# Altium footprint library Reflow3D1411sep.PcbLib: 657 footprints (part 17 of 42)
Each footprint in its own frame and in the unit in brackets; x right, y up, seen from the top. Pads: shape width x height; smd on the part's side, far side on the other; paste and mask are expansions set on the pad; w line width, h text height; cw(c..) or ccw(c..) is an arc to the next point about the centre after c.
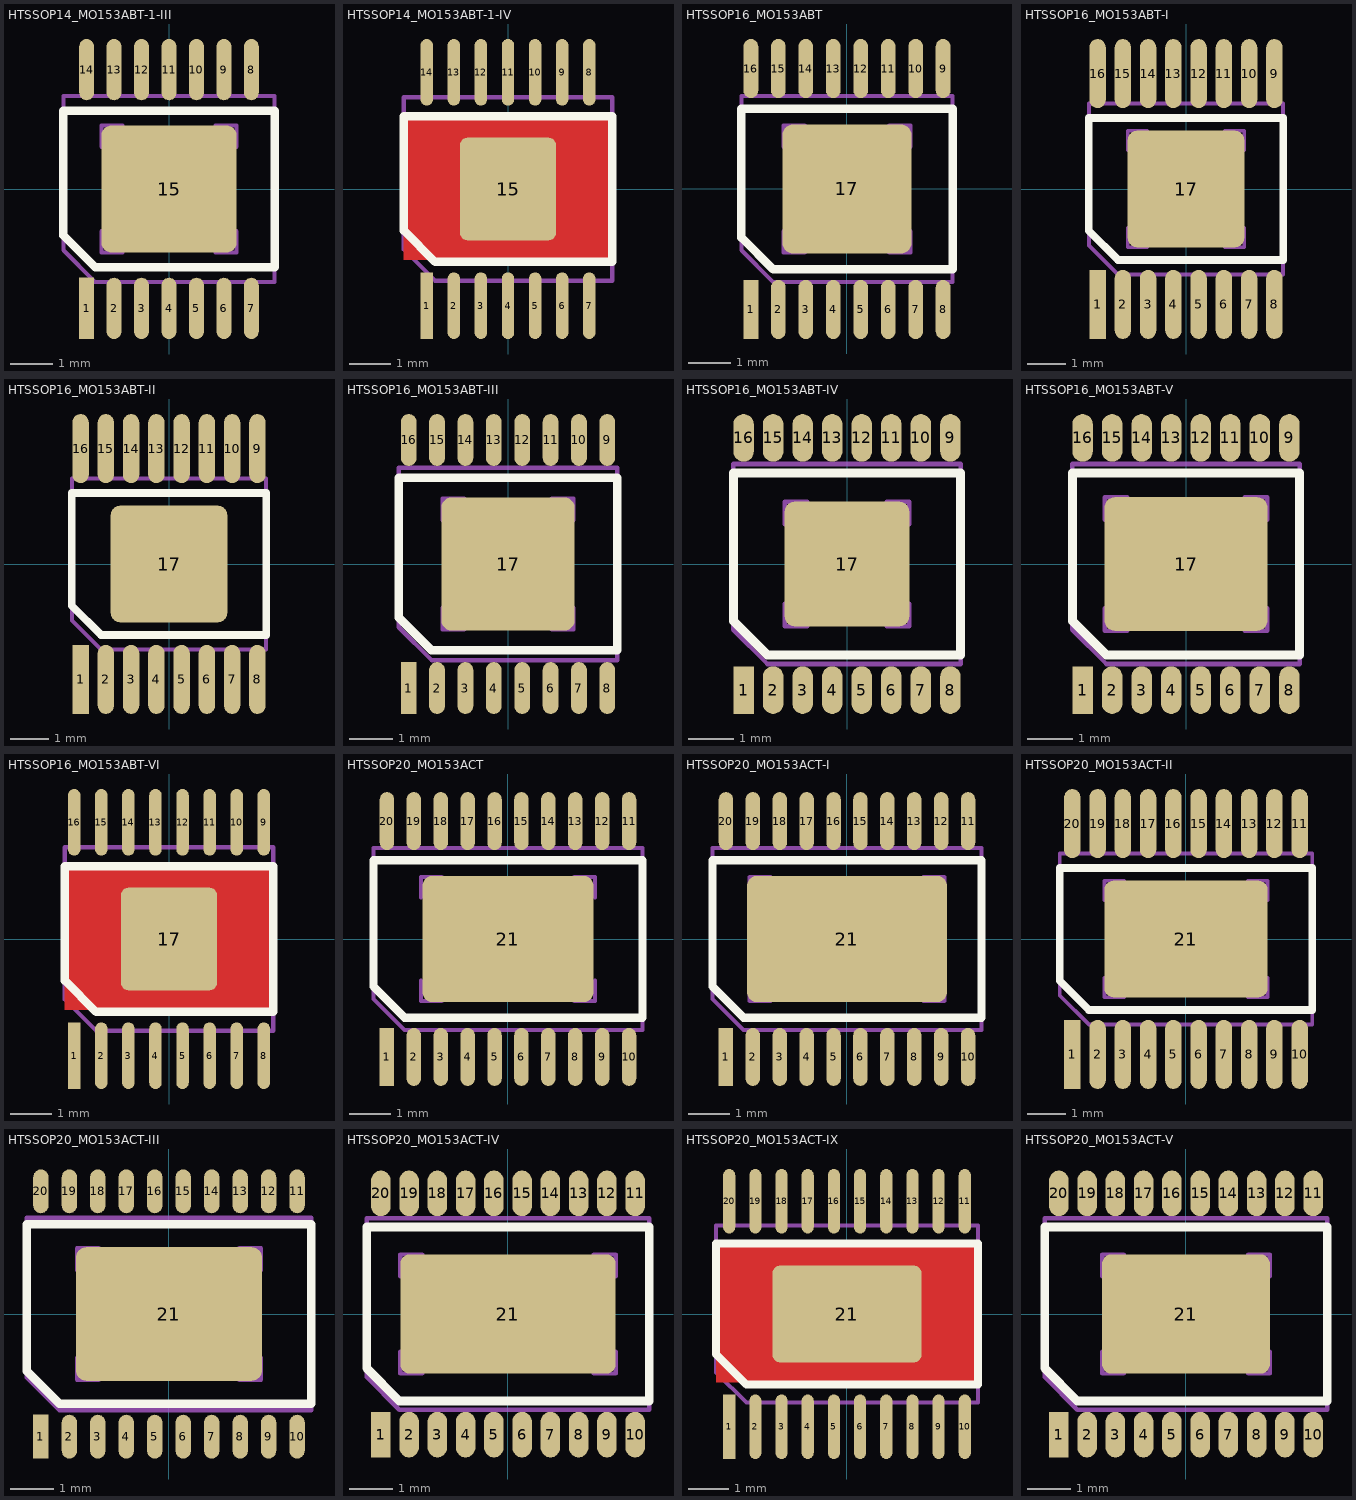
[diagram p16: the footprints below, top view; thin cyan lines are the x and y axes]

## HTSSOP14_MO153ABT-1-III [mm] "www.intersil.com, M14.173A.pdf; www.jedec.org, MO-153f.pdf"
height 1
pads (15):
  rect 0.35x1.45 smd mask+0.075: 1(-1.95,-2.825)
  oval 0.35x1.45 smd mask+0.075: 2(-1.3,-2.825) 3(-0.65,-2.825) 4(0,-2.825) 5(0.65,-2.825) 6(1.3,-2.825) 7(1.95,-2.825) 8(1.95,2.825) 9(1.3,2.825) 10(0.65,2.825) 11(0,2.825) 12(-0.65,2.825) 13(-1.3,2.825) 14(-1.95,2.825)
  rrect15% 3.2x3 smd mask+0.075: 15(0,0)
Top Overlay:
  lines w0.2: -2.5,-1.1 -1.75,-1.85 2.5,-1.85 2.5,1.85 -2.5,1.85 -2.5,-1.1
Mechanical 13:
  lines w0.1: -1.6,-1 -1.6,-1.5 -1.1,-1.5 ; -1.6,1 -1.6,1.5 -1.1,1.5 ; 1.1,-1.5 1.6,-1.5 1.6,-1 ; 1.1,1.5 1.6,1.5 1.6,1 ; -2.5,-1.45 -1.75,-2.2 2.5,-2.2 2.5,2.2 -2.5,2.2 -2.5,-1.45
Mechanical 15:
  lines w0.1: -0.5,0 0.5,0 ; 0,-0.5 0,0.5
3D body: height 1.2, standoff 0, extent -2.55,-2.25 2.55,2.25

## HTSSOP14_MO153ABT-1-IV [mm] "www.ti.com, tlv2474.pdf"
height 1.1
pads (15):
  rect 0.3x1.6 smd mask+0.075: 1(-1.95,-2.8)
  oval 0.3x1.6 smd mask+0.075: 2(-1.3,-2.8) 3(-0.65,-2.8) 4(0,-2.8) 5(0.65,-2.8) 6(1.3,-2.8) 7(1.95,-2.8) 8(1.95,2.8) 9(1.3,2.8) 10(0.65,2.8) 11(0,2.8) 12(-0.65,2.8) 13(-1.3,2.8) 14(-1.95,2.8)
  rrect15% 2.31x2.46 smd mask+0: 15(0,0)
Top Layer:
  region: -2.5,1.7 2.5,1.7 2.5,-1.7 -2.5,-1.7
Top Overlay:
  lines w0.2: -2.5,-1 -1.75,-1.75 2.5,-1.75 2.5,1.75 -2.5,1.75 -2.5,-1
Mechanical 13:
  lines w0.1: -0.915,-0.53 -0.915,-1.03 -0.415,-1.03 ; -0.915,0.53 -0.915,1.03 -0.415,1.03 ; 0.415,-1.03 0.915,-1.03 0.915,-0.53 ; 0.415,1.03 0.915,1.03 0.915,0.53 ; -2.5,-1.45 -1.75,-2.2 2.5,-2.2 2.5,2.2 -2.5,2.2 -2.5,-1.45
Mechanical 15:
  lines w0.1: -0.5,0 0.5,0 ; 0,-0.5 0,0.5
3D body: height 1.2, standoff 0, extent -2.55,-2.25 2.55,2.25

## HTSSOP16_MO153ABT [mm] "www.maxim-ic.com, 21-0108.PDF, 90-0120.PDF"
height 1
pads (17):
  rect 0.35x1.4 smd mask+0.075: 1(-2.275,-2.85)
  oval 0.35x1.4 smd mask+0.075: 2(-1.625,-2.85) 3(-0.975,-2.85) 4(-0.325,-2.85) 5(0.325,-2.85) 6(0.975,-2.85) 7(1.625,-2.85) 8(2.275,-2.85) 9(2.275,2.85) 10(1.625,2.85) 11(0.975,2.85) 12(0.325,2.85) 13(-0.325,2.85) 14(-0.975,2.85) 15(-1.625,2.85) 16(-2.275,2.85)
  rrect15% 3.05x3.05 smd mask+0.075: 17(0,0)
Top Overlay:
  lines w0.2: -2.5,-1.15 -1.75,-1.9 2.5,-1.9 2.5,1.9 -2.5,1.9 -2.5,-1.15
Mechanical 13:
  lines w0.1: -1.5,-1 -1.5,-1.5 -1,-1.5 ; -1.5,1 -1.5,1.5 -1,1.5 ; 1,-1.5 1.5,-1.5 1.5,-1 ; 1,1.5 1.5,1.5 1.5,1 ; -2.5,-1.45 -2.5,2.2 2.5,2.2 2.5,-2.2 -1.75,-2.2 -2.5,-1.45
Mechanical 15:
  lines w0.1: -0.5,0 0.5,0 ; 0,-0.5 0,0.5
3D body: height 1.1, standoff 0, extent -2.55,-2.25 2.55,2.25

## HTSSOP16_MO153ABT-I [mm] "www.national.com, mxa16a.pdf"
height 1
pads (17):
  rect 0.42x1.78 smd mask+0.05: 1(-2.275,-2.97)
  oval 0.42x1.78 smd mask+0.05: 2(-1.625,-2.97) 3(-0.975,-2.97) 4(-0.325,-2.97) 5(0.325,-2.97) 6(0.975,-2.97) 7(1.625,-2.97) 8(2.275,-2.97) 9(2.275,2.97) 10(1.625,2.97) 11(0.975,2.97) 12(0.325,2.97) 13(-0.325,2.97) 14(-0.975,2.97) 15(-1.625,2.97) 16(-2.275,2.97)
  rrect15% 3x3 smd mask+0.075: 17(0,0)
Top Overlay:
  lines w0.2: -2.5,-1.075 -1.75,-1.825 2.5,-1.825 2.5,1.825 -2.5,1.825 -2.5,-1.075
Mechanical 13:
  lines w0.1: -1.5,-1 -1.5,-1.5 -1,-1.5 ; -1.5,1 -1.5,1.5 -1,1.5 ; 1,-1.5 1.5,-1.5 1.5,-1 ; 1,1.5 1.5,1.5 1.5,1 ; -2.5,-1.45 -1.75,-2.2 2.5,-2.2 2.5,2.2 -2.5,2.2 -2.5,-1.45
Mechanical 15:
  lines w0.1: -0.5,0 0.5,0 ; 0,-0.5 0,0.5
3D body: height 1.1, standoff 0, extent -2.55,-2.25 2.55,2.25

## HTSSOP16_MO153ABT-II [mm] "www.fairchildsemi.com, MTF16.pdf"
height 1
pads (17):
  rect 0.42x1.78 smd mask+0.05: 1(-2.275,-2.97)
  oval 0.42x1.78 smd mask+0.05: 2(-1.625,-2.97) 3(-0.975,-2.97) 4(-0.325,-2.97) 5(0.325,-2.97) 6(0.975,-2.97) 7(1.625,-2.97) 8(2.275,-2.97) 9(2.275,2.97) 10(1.625,2.97) 11(0.975,2.97) 12(0.325,2.97) 13(-0.325,2.97) 14(-0.975,2.97) 15(-1.625,2.97) 16(-2.275,2.97)
  rrect15% 3x3 smd mask+0.075: 17(0,0)
Top Overlay:
  lines w0.2: -2.5,-1.075 -1.75,-1.825 2.5,-1.825 2.5,1.825 -2.5,1.825 -2.5,-1.075
Mechanical 13:
  lines w0.1: -1.25,-0.75 -1.25,-1.25 -0.75,-1.25 ; -1.25,0.75 -1.25,1.25 -0.75,1.25 ; 0.75,-1.25 1.25,-1.25 1.25,-0.75 ; 0.75,1.25 1.25,1.25 1.25,0.75 ; -2.5,-1.45 -1.75,-2.2 2.5,-2.2 2.5,2.2 -2.5,2.2 -2.5,-1.45
Mechanical 15:
  lines w0.1: -0.5,0 0.5,0 ; 0,-0.5 0,0.5
3D body: height 1.2, standoff 0, extent -2.55,-2.25 2.55,2.25

## HTSSOP16_MO153ABT-III [mm] "www.analog.com, RE_16_2.pdf, RE-16-2.pdf; www.jedec.org, MO-153f.pdf"
height 1.1
pads (17):
  rect 0.36x1.19 smd mask+0.075: 1(-2.275,-2.84)
  oval 0.36x1.19 smd mask+0.075: 2(-1.625,-2.84) 3(-0.975,-2.84) 4(-0.325,-2.84) 5(0.325,-2.84) 6(0.975,-2.84) 7(1.625,-2.84) 8(2.275,-2.84) 9(2.275,2.84) 10(1.625,2.84) 11(0.975,2.84) 12(0.325,2.84) 13(-0.325,2.84) 14(-0.975,2.84) 15(-1.625,2.84) 16(-2.275,2.84)
  rrect15% 3.05x3.05 smd mask+0.075: 17(0,0)
Top Overlay:
  lines w0.2: -2.5,-1.225 -1.75,-1.975 2.5,-1.975 2.5,1.975 -2.5,1.975 -2.5,-1.225
Mechanical 13:
  lines w0.1: -1.5,-1 -1.5,-1.5 -1,-1.5 ; -1.5,1 -1.5,1.5 -1,1.5 ; 1,-1.5 1.5,-1.5 1.5,-1 ; 1,1.5 1.5,1.5 1.5,1 ; -2.5,-1.45 -2.5,2.2 2.5,2.2 2.5,-2.2 -1.75,-2.2 -2.5,-1.45
Mechanical 15:
  lines w0.1: -0.5,0 0.5,0 ; 0,-0.5 0,0.5
3D body: height 1.2, standoff 0, extent -2.55,-2.25 2.55,2.25

## HTSSOP16_MO153ABT-IV [mm] "www.linear.com, TSSOP_16_05-08-1663_Variation_BA.pdf"
height 1
pads (17):
  rect 0.45x1.05 smd mask+0.05: 1(-2.275,-2.775)
  oval 0.45x1.05 smd mask+0.05: 2(-1.625,-2.775) 3(-0.975,-2.775) 4(-0.325,-2.775) 5(0.325,-2.775) 6(0.975,-2.775) 7(1.625,-2.775) 8(2.275,-2.775) 9(2.275,2.775) 10(1.625,2.775) 11(0.975,2.775) 12(0.325,2.775) 13(-0.325,2.775) 14(-0.975,2.775) 15(-1.625,2.775) 16(-2.275,2.775)
  rrect15% 2.74x2.74 smd mask+0.075: 17(0,0)
Top Overlay:
  lines w0.2: -2.5,-1.25 -2.5,2 2.5,2 2.5,-2 -1.75,-2 -2.5,-1.25
Mechanical 13:
  lines w0.1: -1.37,-0.87 -1.37,-1.37 -0.87,-1.37 ; -1.37,0.87 -1.37,1.37 -0.87,1.37 ; 0.87,-1.37 1.37,-1.37 1.37,-0.87 ; 0.87,1.37 1.37,1.37 1.37,0.87 ; -2.5,-1.45 -1.75,-2.2 2.5,-2.2 2.5,2.2 -2.5,2.2 -2.5,-1.45
Mechanical 15:
  lines w0.1: -0.5,0 0.5,0 ; 0,-0.5 0,0.5
3D body: height 1.1, standoff 0, extent -2.55,-2.25 2.55,2.25

## HTSSOP16_MO153ABT-V [mm] "www.linear.com, TSSOP_16_05-08-1663_Variation_BB.pdf"
height 1
pads (17):
  rect 0.45x1.05 smd mask+0.05: 1(-2.275,-2.775)
  oval 0.45x1.05 smd mask+0.05: 2(-1.625,-2.775) 3(-0.975,-2.775) 4(-0.325,-2.775) 5(0.325,-2.775) 6(0.975,-2.775) 7(1.625,-2.775) 8(2.275,-2.775) 9(2.275,2.775) 10(1.625,2.775) 11(0.975,2.775) 12(0.325,2.775) 13(-0.325,2.775) 14(-0.975,2.775) 15(-1.625,2.775) 16(-2.275,2.775)
  rrect15% 3.58x2.94 smd mask+0.075: 17(0,0)
Top Overlay:
  lines w0.2: -2.5,-1.25 -2.5,2 2.5,2 2.5,-2 -1.75,-2 -2.5,-1.25
Mechanical 13:
  lines w0.1: -1.79,-0.97 -1.79,-1.47 -1.29,-1.47 ; -1.79,0.97 -1.79,1.47 -1.29,1.47 ; 1.29,-1.47 1.79,-1.47 1.79,-0.97 ; 1.29,1.47 1.79,1.47 1.79,0.97 ; -2.5,-1.45 -1.75,-2.2 2.5,-2.2 2.5,2.2 -2.5,2.2 -2.5,-1.45
Mechanical 15:
  lines w0.1: -0.5,0 0.5,0 ; 0,-0.5 0,0.5
3D body: height 1.1, standoff 0, extent -2.55,-2.25 2.55,2.25

## HTSSOP16_MO153ABT-VI [mm] "www.ti.com, tlv2474.pdf"
height 1.1
pads (17):
  rect 0.3x1.6 smd mask+0.075: 1(-2.275,-2.8)
  oval 0.3x1.6 smd mask+0.075: 2(-1.625,-2.8) 3(-0.975,-2.8) 4(-0.325,-2.8) 5(0.325,-2.8) 6(0.975,-2.8) 7(1.625,-2.8) 8(2.275,-2.8) 9(2.275,2.8) 10(1.625,2.8) 11(0.975,2.8) 12(0.325,2.8) 13(-0.325,2.8) 14(-0.975,2.8) 15(-1.625,2.8) 16(-2.275,2.8)
  rrect15% 2.31x2.46 smd mask+0: 17(0,0)
Top Layer:
  region: -2.5,1.7 2.5,1.7 2.5,-1.7 -2.5,-1.7
Top Overlay:
  lines w0.2: -2.5,-1 -2.5,1.75 2.5,1.75 2.5,-1.75 -1.75,-1.75 -2.5,-1
Mechanical 13:
  lines w0.1: -0.935,-0.555 -0.935,-1.055 -0.435,-1.055 ; -0.935,0.555 -0.935,1.055 -0.435,1.055 ; 0.435,-1.055 0.935,-1.055 0.935,-0.555 ; 0.435,1.055 0.935,1.055 0.935,0.555 ; -2.5,-1.45 -2.5,2.2 2.5,2.2 2.5,-2.2 -1.75,-2.2 -2.5,-1.45
Mechanical 15:
  lines w0.1: -0.5,0 0.5,0 ; 0,-0.5 0,0.5
3D body: height 1.2, standoff 0, extent -2.55,-2.25 2.55,2.25

## HTSSOP20_MO153ACT [mm] "www.maxim-ic.com, 21-0108.PDF, 90-0114.PDF"
height 1
pads (21):
  rect 0.35x1.4 smd mask+0.075: 1(-2.925,-2.85)
  oval 0.35x1.4 smd mask+0.075: 2(-2.275,-2.85) 3(-1.625,-2.85) 4(-0.975,-2.85) 5(-0.325,-2.85) 6(0.325,-2.85) 7(0.975,-2.85) 8(1.625,-2.85) 9(2.275,-2.85) 10(2.925,-2.85) 11(2.925,2.85) 12(2.275,2.85) 13(1.625,2.85) 14(0.975,2.85) 15(0.325,2.85) 16(-0.325,2.85) 17(-0.975,2.85) 18(-1.625,2.85) 19(-2.275,2.85) 20(-2.925,2.85)
  rrect15% 4.13x3.05 smd mask+0.075: 21(0,0)
Top Overlay:
  lines w0.2: -3.25,-1.15 -3.25,1.9 3.25,1.9 3.25,-1.9 -2.5,-1.9 -3.25,-1.15
Mechanical 13:
  lines w0.1: -2.1,-1 -2.1,-1.5 -1.6,-1.5 ; -2.1,1 -2.1,1.5 -1.6,1.5 ; 1.6,-1.5 2.1,-1.5 2.1,-1 ; 1.6,1.5 2.1,1.5 2.1,1 ; -3.25,-1.45 -2.5,-2.2 3.25,-2.2 3.25,2.2 -3.25,2.2 -3.25,-1.45
Mechanical 15:
  lines w0.1: -0.5,0 0.5,0 ; 0,-0.5 0,0.5
3D body: height 1.1, standoff 0, extent -3.3,-2.25 3.3,2.25

## HTSSOP20_MO153ACT-I [mm] "www.maxim-ic.com, 21-0108.PDF, 90-0115.PDF"
height 1
pads (21):
  rect 0.35x1.4 smd mask+0.075: 1(-2.925,-2.85)
  oval 0.35x1.4 smd mask+0.075: 2(-2.275,-2.85) 3(-1.625,-2.85) 4(-0.975,-2.85) 5(-0.325,-2.85) 6(0.325,-2.85) 7(0.975,-2.85) 8(1.625,-2.85) 9(2.275,-2.85) 10(2.925,-2.85) 11(2.925,2.85) 12(2.275,2.85) 13(1.625,2.85) 14(0.975,2.85) 15(0.325,2.85) 16(-0.325,2.85) 17(-0.975,2.85) 18(-1.625,2.85) 19(-2.275,2.85) 20(-2.925,2.85)
  rrect15% 4.83x3.05 smd mask+0.075: 21(0,0)
Top Overlay:
  lines w0.2: -3.25,-1.15 -2.5,-1.9 3.25,-1.9 3.25,1.9 -3.25,1.9 -3.25,-1.15
Mechanical 13:
  lines w0.1: -2.35,-1 -2.35,-1.5 -1.85,-1.5 ; -2.35,1 -2.35,1.5 -1.85,1.5 ; 1.85,-1.5 2.35,-1.5 2.35,-1 ; 1.85,1.5 2.35,1.5 2.35,1 ; -3.25,-1.45 -3.25,2.2 3.25,2.2 3.25,-2.2 -2.5,-2.2 -3.25,-1.45
Mechanical 15:
  lines w0.1: -0.5,0 0.5,0 ; 0,-0.5 0,0.5
3D body: height 1.1, standoff 0, extent -3.3,-2.25 3.3,2.25

## HTSSOP20_MO153ACT-II [mm] "www.national.com, mxa20a.pdf"
height 1
pads (21):
  rect 0.42x1.78 smd mask+0.05: 1(-2.925,-2.97)
  oval 0.42x1.78 smd mask+0.05: 2(-2.275,-2.97) 3(-1.625,-2.97) 4(-0.975,-2.97) 5(-0.325,-2.97) 6(0.325,-2.97) 7(0.975,-2.97) 8(1.625,-2.97) 9(2.275,-2.97) 10(2.925,-2.97) 11(2.925,2.97) 12(2.275,2.97) 13(1.625,2.97) 14(0.975,2.97) 15(0.325,2.97) 16(-0.325,2.97) 17(-0.975,2.97) 18(-1.625,2.97) 19(-2.275,2.97) 20(-2.925,2.97)
  rrect15% 4.2x3 smd mask+0.075: 21(0,0)
Top Overlay:
  lines w0.2: -3.25,-1.075 -3.25,1.825 3.25,1.825 3.25,-1.825 -2.5,-1.825 -3.25,-1.075
Mechanical 13:
  lines w0.1: -2.1,-1 -2.1,-1.5 -1.6,-1.5 ; -2.1,1 -2.1,1.5 -1.6,1.5 ; 1.6,-1.5 2.1,-1.5 2.1,-1 ; 1.6,1.5 2.1,1.5 2.1,1 ; -3.25,-1.45 -2.5,-2.2 3.25,-2.2 3.25,2.2 -3.25,2.2 -3.25,-1.45
Mechanical 15:
  lines w0.1: -0.5,0 0.5,0 ; 0,-0.5 0,0.5
3D body: height 1.1, standoff 0, extent -3.3,-2.25 3.3,2.25

## HTSSOP20_MO153ACT-III [mm] "www.analog.com, RE_20_1.pdf, RE-20-1.pdf; www.jedec.org, MO-153f.pdf"
height 1.1
pads (21):
  rect 0.35x1 smd mask+0.075: 1(-2.925,-2.8)
  oval 0.35x1 smd mask+0.075: 2(-2.275,-2.8) 3(-1.625,-2.8) 4(-0.975,-2.8) 5(-0.325,-2.8) 6(0.325,-2.8) 7(0.975,-2.8) 8(1.625,-2.8) 9(2.275,-2.8) 10(2.925,-2.8) 11(2.925,2.8) 12(2.275,2.8) 13(1.625,2.8) 14(0.975,2.8) 15(0.325,2.8) 16(-0.325,2.8) 17(-0.975,2.8) 18(-1.625,2.8) 19(-2.275,2.8) 20(-2.925,2.8)
  rrect15% 4.25x3.05 smd mask+0.075: 21(0,0)
Top Overlay:
  lines w0.2: -3.25,-1.3 -2.5,-2.05 3.25,-2.05 3.25,2.05 -3.25,2.05 -3.25,-1.3
Mechanical 13:
  lines w0.1: -2.1,-1 -2.1,-1.5 -1.6,-1.5 ; -2.1,1 -2.1,1.5 -1.6,1.5 ; 1.6,-1.5 2.1,-1.5 2.1,-1 ; 1.6,1.5 2.1,1.5 2.1,1 ; -3.25,-1.45 -3.25,2.2 3.25,2.2 3.25,-2.2 -2.5,-2.2 -3.25,-1.45
Mechanical 15:
  lines w0.1: -0.5,0 0.5,0 ; 0,-0.5 0,0.5
3D body: height 1.2, standoff 0, extent -3.3,-2.25 3.3,2.25

## HTSSOP20_MO153ACT-IV [mm] "www.linear.com, TSSOP_20_05-08-1663_Variation_CA.pdf"
height 1.1
pads (21):
  rect 0.45x1.05 smd mask+0.05: 1(-2.925,-2.775)
  oval 0.45x1.05 smd mask+0.05: 2(-2.275,-2.775) 3(-1.625,-2.775) 4(-0.975,-2.775) 5(-0.325,-2.775) 6(0.325,-2.775) 7(0.975,-2.775) 8(1.625,-2.775) 9(2.275,-2.775) 10(2.925,-2.775) 11(2.925,2.775) 12(2.275,2.775) 13(1.625,2.775) 14(0.975,2.775) 15(0.325,2.775) 16(-0.325,2.775) 17(-0.975,2.775) 18(-1.625,2.775) 19(-2.275,2.775) 20(-2.925,2.775)
  rrect15% 4.95x2.74 smd mask+0.075: 21(0,0)
Top Overlay:
  lines w0.2: -3.25,-1.25 -2.5,-2 3.25,-2 3.25,2 -3.25,2 -3.25,-1.25
Mechanical 13:
  lines w0.1: -2.475,-0.87 -2.475,-1.37 -1.975,-1.37 ; -2.475,0.87 -2.475,1.37 -1.975,1.37 ; 1.975,-1.37 2.475,-1.37 2.475,-0.87 ; 1.975,1.37 2.475,1.37 2.475,0.87 ; -3.25,-1.45 -3.25,2.2 3.25,2.2 3.25,-2.2 -2.5,-2.2 -3.25,-1.45
Mechanical 15:
  lines w0.1: -0.5,0 0.5,0 ; 0,-0.5 0,0.5
3D body: height 1.2, standoff 0, extent -3.3,-2.25 3.3,2.25

## HTSSOP20_MO153ACT-IX [mm] "www.ti.com, tpic9201.pdf"
height 1.1
pads (21):
  rect 0.3x1.6 smd mask+0.075: 1(-2.925,-2.8)
  oval 0.3x1.6 smd mask+0.075: 2(-2.275,-2.8) 3(-1.625,-2.8) 4(-0.975,-2.8) 5(-0.325,-2.8) 6(0.325,-2.8) 7(0.975,-2.8) 8(1.625,-2.8) 9(2.275,-2.8) 10(2.925,-2.8) 11(2.925,2.8) 12(2.275,2.8) 13(1.625,2.8) 14(0.975,2.8) 15(0.325,2.8) 16(-0.325,2.8) 17(-0.975,2.8) 18(-1.625,2.8) 19(-2.275,2.8) 20(-2.925,2.8)
  rrect15% 3.7x2.4 smd mask+0: 21(0,0)
Top Layer:
  region: -3.25,1.7 3.25,1.7 3.25,-1.7 -3.25,-1.7
Top Overlay:
  lines w0.2: -3.25,-1 -3.25,1.75 3.25,1.75 3.25,-1.75 -2.5,-1.75 -3.25,-1
Mechanical 13:
  lines w0.1: -1.505,-0.505 -1.505,-1.005 -1.005,-1.005 ; -1.505,0.505 -1.505,1.005 -1.005,1.005 ; 1.005,-1.005 1.505,-1.005 1.505,-0.505 ; 1.005,1.005 1.505,1.005 1.505,0.505 ; -3.25,-1.45 -2.5,-2.2 3.25,-2.2 3.25,2.2 -3.25,2.2 -3.25,-1.45
Mechanical 15:
  lines w0.1: -0.5,0 0.5,0 ; 0,-0.5 0,0.5
3D body: height 1.2, standoff 0, extent -3.3,-2.25 3.3,2.25

## HTSSOP20_MO153ACT-V [mm] "www.linear.com, TSSOP_20_05-08-1663_Variation_CB.pdf"
height 1.1
pads (21):
  rect 0.45x1.05 smd mask+0.05: 1(-2.925,-2.775)
  oval 0.45x1.05 smd mask+0.05: 2(-2.275,-2.775) 3(-1.625,-2.775) 4(-0.975,-2.775) 5(-0.325,-2.775) 6(0.325,-2.775) 7(0.975,-2.775) 8(1.625,-2.775) 9(2.275,-2.775) 10(2.925,-2.775) 11(2.925,2.775) 12(2.275,2.775) 13(1.625,2.775) 14(0.975,2.775) 15(0.325,2.775) 16(-0.325,2.775) 17(-0.975,2.775) 18(-1.625,2.775) 19(-2.275,2.775) 20(-2.925,2.775)
  rrect15% 3.86x2.74 smd mask+0.075: 21(0,0)
Top Overlay:
  lines w0.2: -3.25,-1.25 -3.25,2 3.25,2 3.25,-2 -2.5,-2 -3.25,-1.25
Mechanical 13:
  lines w0.1: -1.93,-0.87 -1.93,-1.37 -1.43,-1.37 ; -1.93,0.87 -1.93,1.37 -1.43,1.37 ; 1.43,-1.37 1.93,-1.37 1.93,-0.87 ; 1.43,1.37 1.93,1.37 1.93,0.87 ; -3.25,-1.45 -2.5,-2.2 3.25,-2.2 3.25,2.2 -3.25,2.2 -3.25,-1.45
Mechanical 15:
  lines w0.1: -0.5,0 0.5,0 ; 0,-0.5 0,0.5
3D body: height 1.2, standoff 0, extent -3.3,-2.25 3.3,2.25